# Altium footprint library PcbLib1.PcbLib: 5 footprints
Each footprint in its own frame and in the unit in brackets; x right, y up, seen from the top. Pads: shape width x height; smd on the part's side, far side on the other; paste and mask are expansions set on the pad; w line width, h text height; cw(c..) or ccw(c..) is an arc to the next point about the centre after c.
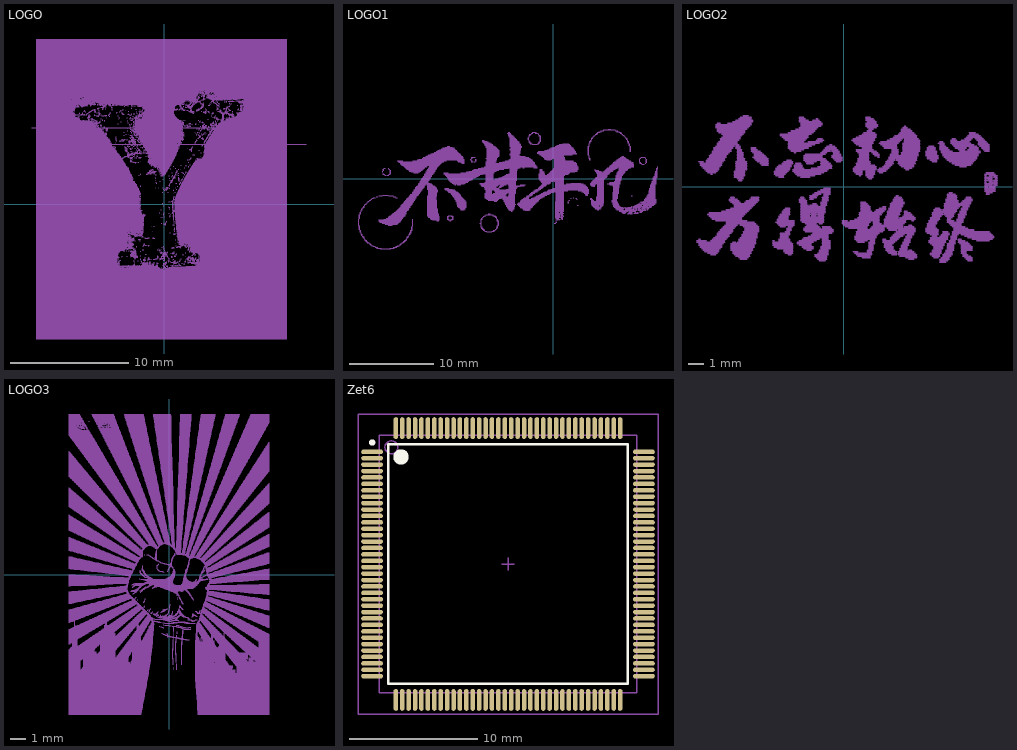
[diagram p0: the footprints below, top view; thin cyan lines are the x and y axes]

## LOGO [mm]
Bottom Overlay:
  drawing of 6696 lines, arcs and shapes, not listed

## LOGO1 [mm]
Bottom Overlay:
  drawing of 1032 lines, arcs and shapes, not listed

## LOGO2 [mm]
Bottom Overlay:
  drawing of 734 lines, arcs and shapes, not listed

## LOGO3 [mm]
Bottom Overlay:
  drawing of 7459 lines, arcs and shapes, not listed

## Zet6 [mm] "TSQFP, 144-Leads, Body 22.2x22.2mm (max), Pitch 0.50mm, IPC Medium Density"
height 1.6
pads (144):
  oval 1.7x0.35 smd: 1(-31.8,29.95) 2(-31.8,29.45) 3(-31.8,28.95) 4(-31.8,28.45) 5(-31.8,27.95) 6(-31.8,27.45) 7(-31.8,26.95) 8(-31.8,26.45) 9(-31.8,25.95) 10(-31.8,25.45) 11(-31.8,24.95) 12(-31.8,24.45) 13(-31.8,23.95) 14(-31.8,23.45) 15(-31.8,22.95) 16(-31.8,22.45) 17(-31.8,21.95) 18(-31.8,21.45) 19(-31.8,20.95) 20(-31.8,20.45) 21(-31.8,19.95) 22(-31.8,19.45) 23(-31.8,18.95) 24(-31.8,18.45) 25(-31.8,17.95) 26(-31.8,17.45) 27(-31.8,16.95) 28(-31.8,16.45) 29(-31.8,15.95) 30(-31.8,15.45) 31(-31.8,14.95) 32(-31.8,14.45) 33(-31.8,13.95) 34(-31.8,13.45) 35(-31.8,12.95) 36(-31.8,12.45) 73(-10.6,12.45) 74(-10.6,12.95) 75(-10.6,13.45) 76(-10.6,13.95) 77(-10.6,14.45) 78(-10.6,14.95) 79(-10.6,15.45) 80(-10.6,15.95) 81(-10.6,16.45) 82(-10.6,16.95) 83(-10.6,17.45) 84(-10.6,17.95) 85(-10.6,18.45) 86(-10.6,18.95) 87(-10.6,19.45) 88(-10.6,19.95) 89(-10.6,20.45) 90(-10.6,20.95) 91(-10.6,21.45) 92(-10.6,21.95) 93(-10.6,22.45) 94(-10.6,22.95) 95(-10.6,23.45) 96(-10.6,23.95) 97(-10.6,24.45) 98(-10.6,24.95) 99(-10.6,25.45) 100(-10.6,25.95) 101(-10.6,26.45) 102(-10.6,26.95) 103(-10.6,27.45) 104(-10.6,27.95) 105(-10.6,28.45) 106(-10.6,28.95) 107(-10.6,29.45) 108(-10.6,29.95)
  oval 0.35x1.7 smd: 37(-29.95,10.6) 38(-29.45,10.6) 39(-28.95,10.6) 40(-28.45,10.6) 41(-27.95,10.6) 42(-27.45,10.6) 43(-26.95,10.6) 44(-26.45,10.6) 45(-25.95,10.6) 46(-25.45,10.6) 47(-24.95,10.6) 48(-24.45,10.6) 49(-23.95,10.6) 50(-23.45,10.6) 51(-22.95,10.6) 52(-22.45,10.6) 53(-21.95,10.6) 54(-21.45,10.6) 55(-20.95,10.6) 56(-20.45,10.6) 57(-19.95,10.6) 58(-19.45,10.6) 59(-18.95,10.6) 60(-18.45,10.6) 61(-17.95,10.6) 62(-17.45,10.6) 63(-16.95,10.6) 64(-16.45,10.6) 65(-15.95,10.6) 66(-15.45,10.6) 67(-14.95,10.6) 68(-14.45,10.6) 69(-13.95,10.6) 70(-13.45,10.6) 71(-12.95,10.6) 72(-12.45,10.6) 109(-12.45,31.8) 110(-12.95,31.8) 111(-13.45,31.8) 112(-13.95,31.8) 113(-14.45,31.8) 114(-14.95,31.8) 115(-15.45,31.8) 116(-15.95,31.8) 117(-16.45,31.8) 118(-16.95,31.8) 119(-17.45,31.8) 120(-17.95,31.8) 121(-18.45,31.8) 122(-18.95,31.8) 123(-19.45,31.8) 124(-19.95,31.8) 125(-20.45,31.8) 126(-20.95,31.8) 127(-21.45,31.8) 128(-21.95,31.8) 129(-22.45,31.8) 130(-22.95,31.8) 131(-23.45,31.8) 132(-23.95,31.8) 133(-24.45,31.8) 134(-24.95,31.8) 135(-25.45,31.8) 136(-25.95,31.8) 137(-26.45,31.8) 138(-26.95,31.8) 139(-27.45,31.8) 140(-27.95,31.8) 141(-28.45,31.8) 142(-28.95,31.8) 143(-29.45,31.8) 144(-29.95,31.8)
Top Overlay:
  circle w0.6: c-29.55,29.55 r0.3
  circle w0.25: c-31.8,30.675 r0.125
  lines w0.2: -30.55,11.85 -11.85,11.85 -11.85,30.55 -30.55,30.55 -30.55,11.85
Mechanical 13:
  circle w0.1: c-30.3,30.3 r0.5
  lines w0.1: -31.25,11.15 -11.15,11.15 -11.15,31.25 -31.25,31.25 -31.25,11.15
Mechanical 15:
  lines w0.1: -21.7,21.2 -20.7,21.2 ; -21.2,20.7 -21.2,21.7 ; -32.9,9.5 -9.5,9.5 -9.5,32.9 -32.9,32.9 -32.9,9.5
3D body: height 1.6, standoff 0.05, extent -31.25,11.15 -11.15,31.25